# Altium footprint library PCB_Library.PcbLib: 110 footprints (part 7 of 7)
Each footprint in its own frame and in the unit in brackets; x right, y up, seen from the top. Pads: shape width x height; smd on the part's side, far side on the other; paste and mask are expansions set on the pad; w line width, h text height; cw(c..) or ccw(c..) is an arc to the next point about the centre after c.
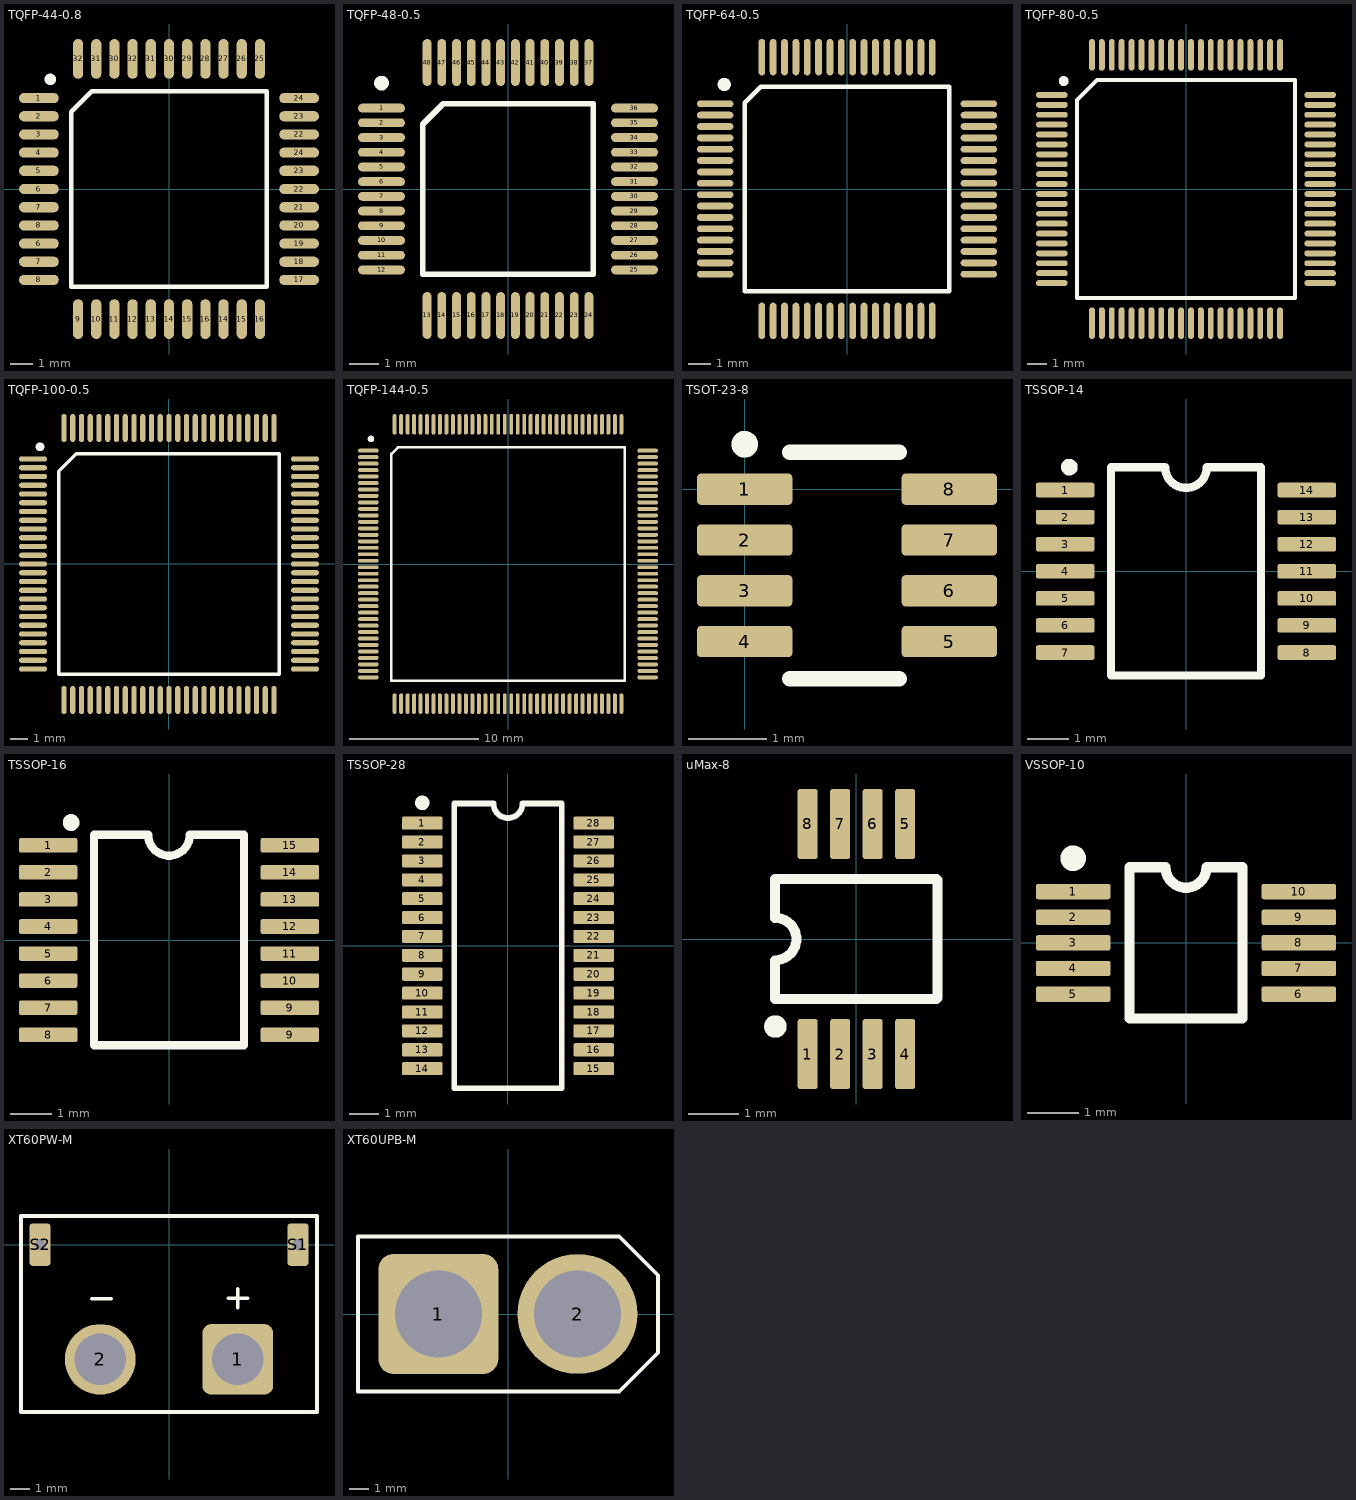
[diagram p6: the footprints below, top view; thin cyan lines are the x and y axes]

## TQFP-44-0.8 [mm]
height 1.2
pads (44):
  oval 1.75x0.45 smd paste-0.075 mask+0.05: 1(-5.725,4) 2(-5.725,3.2) 3(-5.725,2.4) 4(-5.725,1.6) 5(-5.725,0.8) 6(-5.725,-2.4) 6(-5.725,0) 7(-5.725,-3.2) 7(-5.725,-0.8) 8(-5.725,-4) 8(-5.725,-1.6) 17(5.725,-4) 18(5.725,-3.2) 19(5.725,-2.4) 20(5.725,-1.6) 21(5.725,-0.8) 22(5.725,0) 22(5.725,2.4) 23(5.725,0.8) 23(5.725,3.2) 24(5.725,1.6) 24(5.725,4)
  oval 0.45x1.75 smd paste-0.075 mask+0.05: 9(-4,-5.725) 10(-3.2,-5.725) 11(-2.4,-5.725) 12(-1.6,-5.725) 13(-0.8,-5.725) 14(0,-5.725) 14(2.4,-5.725) 15(0.8,-5.725) 15(3.2,-5.725) 16(1.6,-5.725) 16(4,-5.725) 25(4,5.725) 26(3.2,5.725) 27(2.4,5.725) 28(1.6,5.725) 29(0.8,5.725) 30(-2.4,5.725) 30(0,5.725) 31(-3.2,5.725) 31(-0.8,5.725) 32(-4,5.725) 32(-1.6,5.725)
Top Overlay:
  circle w0.25: c-5.225,4.825 r0.125
  lines w0.2: -4.3,-4.3 -4.3,3.4 -3.4,4.3 4.3,4.3 4.3,-4.3 -4.3,-4.3
3D body "TQFP80P1200X1200X105-44N.step": height 1.05, standoff 0, extent -6,-6 6,6

## TQFP-48-0.5 [mm]
pads (48):
  oval 1.6x0.3 smd paste-0.05 mask+0.05: 1(-4.3,2.75) 2(-4.3,2.25) 3(-4.3,1.75) 4(-4.3,1.25) 5(-4.3,0.75) 6(-4.3,0.25) 7(-4.3,-0.25) 8(-4.3,-0.75) 9(-4.3,-1.25) 10(-4.3,-1.75) 11(-4.3,-2.25) 12(-4.3,-2.75) 25(4.3,-2.75) 26(4.3,-2.25) 27(4.3,-1.75) 28(4.3,-1.25) 29(4.3,-0.75) 30(4.3,-0.25) 31(4.3,0.25) 32(4.3,0.75) 33(4.3,1.25) 34(4.3,1.75) 35(4.3,2.25) 36(4.3,2.75)
  oval 0.3x1.6 smd paste-0.05 mask+0.05: 13(-2.75,-4.3) 14(-2.25,-4.3) 15(-1.75,-4.3) 16(-1.25,-4.3) 17(-0.75,-4.3) 18(-0.25,-4.3) 19(0.25,-4.3) 20(0.75,-4.3) 21(1.25,-4.3) 22(1.75,-4.3) 23(2.25,-4.3) 24(2.75,-4.3) 37(2.75,4.3) 38(2.25,4.3) 39(1.75,4.3) 40(1.25,4.3) 41(0.75,4.3) 42(0.25,4.3) 43(-0.25,4.3) 44(-0.75,4.3) 45(-1.25,4.3) 46(-1.75,4.3) 47(-2.25,4.3) 48(-2.75,4.3)
Top Overlay:
  circle w0.3: c-4.3,3.6 r0.1
  lines w0.2: -2.9,-2.9 -2.7,-2.9 2.9,-2.9 2.9,2.9 -0.3,2.9 -2.2,2.9 -2.9,2.2 -2.9,-2.9
3D body "TSQFP50P900X900X120-48N.step": height 1.2, standoff 0, extent -4.5,-4.5 4.5,4.5

## TQFP-64-0.5 [mm]
pads (64):
  oval 1.6x0.3 smd paste-0.05 mask+0.05: 1(-5.8,3.75) 2(-5.8,3.25) 3(-5.8,2.75) 4(-5.8,2.25) 5(-5.8,1.75) 6(-5.8,1.25) 7(-5.8,0.75) 8(-5.8,0.25) 9(-5.8,-0.25) 10(-5.8,-0.75) 11(-5.8,-1.25) 12(-5.8,-1.75) 13(-5.8,-2.25) 14(-5.8,-2.75) 15(-5.8,-3.25) 16(-5.8,-3.75) 33(5.8,-3.75) 34(5.8,-3.25) 35(5.8,-2.75) 36(5.8,-2.25) 37(5.8,-1.75) 38(5.8,-1.25) 39(5.8,-0.75) 40(5.8,-0.25) 41(5.8,0.25) 42(5.8,0.75) 43(5.8,1.25) 44(5.8,1.75) 45(5.8,2.25) 46(5.8,2.75) 47(5.8,3.25) 48(5.8,3.75)
  oval 0.3x1.6 smd paste-0.05 mask+0.05: 17(-3.75,-5.8) 18(-3.25,-5.8) 19(-2.75,-5.8) 20(-2.25,-5.8) 21(-1.75,-5.8) 22(-1.25,-5.8) 23(-0.75,-5.8) 24(-0.25,-5.8) 25(0.25,-5.8) 26(0.75,-5.8) 27(1.25,-5.8) 28(1.75,-5.8) 29(2.25,-5.8) 30(2.75,-5.8) 31(3.25,-5.8) 32(3.75,-5.8) 49(3.75,5.8) 50(3.25,5.8) 51(2.75,5.8) 52(2.25,5.8) 53(1.75,5.8) 54(1.25,5.8) 55(0.75,5.8) 56(0.25,5.8) 57(-0.25,5.8) 58(-0.75,5.8) 59(-1.25,5.8) 60(-1.75,5.8) 61(-2.25,5.8) 62(-2.75,5.8) 63(-3.25,5.8) 64(-3.75,5.8)
Top Overlay:
  circle w0.3: c-5.4,4.6 r0.141
  lines w0.2: -4.5,-4.5 -4.5,3.8 -3.8,4.5 -0.9,4.5 4.5,4.5 4.5,-4.5 -4.5,-4.5
3D body "TSQFP50P1200X1200X105-64N.step": height 1.05, standoff 0, extent -6,-6 6,6

## TQFP-80-0.5 [mm]
height 1.2
pads (80):
  oval 1.6x0.3 smd paste-0.05 mask+0.05: 1(-6.775,4.75) 2(-6.775,4.25) 3(-6.775,3.75) 4(-6.775,3.25) 5(-6.775,2.75) 6(-6.775,2.25) 7(-6.775,1.75) 8(-6.775,1.25) 9(-6.775,0.75) 10(-6.775,0.25) 11(-6.775,-0.25) 12(-6.775,-0.75) 13(-6.775,-1.25) 14(-6.775,-1.75) 15(-6.775,-2.25) 16(-6.775,-2.75) 17(-6.775,-3.25) 18(-6.775,-3.75) 19(-6.775,-4.25) 20(-6.775,-4.75) 41(6.775,-4.75) 42(6.775,-4.25) 43(6.775,-3.75) 44(6.775,-3.25) 45(6.775,-2.75) 46(6.775,-2.25) 47(6.775,-1.75) 48(6.775,-1.25) 49(6.775,-0.75) 50(6.775,-0.25) 51(6.775,0.25) 52(6.775,0.75) 53(6.775,1.25) 54(6.775,1.75) 55(6.775,2.25) 56(6.775,2.75) 57(6.775,3.25) 58(6.775,3.75) 59(6.775,4.25) 60(6.775,4.75)
  oval 0.3x1.6 smd paste-0.05 mask+0.05: 21(-4.75,-6.775) 22(-4.25,-6.775) 23(-3.75,-6.775) 24(-3.25,-6.775) 25(-2.75,-6.775) 26(-2.25,-6.775) 27(-1.75,-6.775) 28(-1.25,-6.775) 29(-0.75,-6.775) 30(-0.25,-6.775) 31(0.25,-6.775) 32(0.75,-6.775) 33(1.25,-6.775) 34(1.75,-6.775) 35(2.25,-6.775) 36(2.75,-6.775) 37(3.25,-6.775) 38(3.75,-6.775) 39(4.25,-6.775) 40(4.75,-6.775) 61(4.75,6.775) 62(4.25,6.775) 63(3.75,6.775) 64(3.25,6.775) 65(2.75,6.775) 66(2.25,6.775) 67(1.75,6.775) 68(1.25,6.775) 69(0.75,6.775) 70(0.25,6.775) 71(-0.25,6.775) 72(-0.75,6.775) 73(-1.25,6.775) 74(-1.75,6.775) 75(-2.25,6.775) 76(-2.75,6.775) 77(-3.25,6.775) 78(-3.75,6.775) 79(-4.25,6.775) 80(-4.75,6.775)
Top Overlay:
  circle w0.25: c-6.175,5.45 r0.125
  lines w0.2: -5.5,-5.5 -5.5,4.5 -4.5,5.5 5.5,5.5 5.5,-5.5 -5.5,-5.5
3D body "TSQFP50P1400X1400X150-80N.step": height 1.5, standoff 0, extent -7,-7 7,7

## TQFP-100-0.5 [mm]
height 1.1
pads (100):
  oval 1.6x0.3 smd paste-0.05 mask+0.05: 1(-7.775,6) 2(-7.775,5.5) 3(-7.775,5) 4(-7.775,4.5) 5(-7.775,4) 6(-7.775,3.5) 7(-7.775,3) 8(-7.775,2.5) 9(-7.775,2) 10(-7.775,1.5) 11(-7.775,1) 12(-7.775,0.5) 13(-7.775,0) 14(-7.775,-0.5) 15(-7.775,-1) 16(-7.775,-1.5) 17(-7.775,-2) 18(-7.775,-2.5) 19(-7.775,-3) 20(-7.775,-3.5) 21(-7.775,-4) 22(-7.775,-4.5) 23(-7.775,-5) 24(-7.775,-5.5) 25(-7.775,-6) 51(7.775,-6) 52(7.775,-5.5) 53(7.775,-5) 54(7.775,-4.5) 55(7.775,-4) 56(7.775,-3.5) 57(7.775,-3) 58(7.775,-2.5) 59(7.775,-2) 60(7.775,-1.5) 61(7.775,-1) 62(7.775,-0.5) 63(7.775,0) 64(7.775,0.5) 65(7.775,1) 66(7.775,1.5) 67(7.775,2) 68(7.775,2.5) 69(7.775,3) 70(7.775,3.5) 71(7.775,4) 72(7.775,4.5) 73(7.775,5) 74(7.775,5.5) 75(7.775,6)
  oval 0.3x1.6 smd paste-0.05 mask+0.05: 26(-6,-7.775) 27(-5.5,-7.775) 28(-5,-7.775) 29(-4.5,-7.775) 30(-4,-7.775) 31(-3.5,-7.775) 32(-3,-7.775) 33(-2.5,-7.775) 34(-2,-7.775) 35(-1.5,-7.775) 36(-1,-7.775) 37(-0.5,-7.775) 38(0,-7.775) 39(0.5,-7.775) 40(1,-7.775) 41(1.5,-7.775) 42(2,-7.775) 43(2.5,-7.775) 44(3,-7.775) 45(3.5,-7.775) 46(4,-7.775) 47(4.5,-7.775) 48(5,-7.775) 49(5.5,-7.775) 50(6,-7.775) 76(6,7.775) 77(5.5,7.775) 78(5,7.775) 79(4.5,7.775) 80(4,7.775) 81(3.5,7.775) 82(3,7.775) 83(2.5,7.775) 84(2,7.775) 85(1.5,7.775) 86(1,7.775) 87(0.5,7.775) 88(0,7.775) 89(-0.5,7.775) 90(-1,7.775) 91(-1.5,7.775) 92(-2,7.775) 93(-2.5,7.775) 94(-3,7.775) 95(-3.5,7.775) 96(-4,7.775) 97(-4.5,7.775) 98(-5,7.775) 99(-5.5,7.775) 100(-6,7.775)
Top Overlay:
  circle w0.25: c-7.375,6.7 r0.125
  lines w0.2: -6.3,-6.3 -6.3,5.3 -5.3,6.3 6.3,6.3 6.3,-6.3 -6.3,-6.3
3D body "TSQFP50P1600X1600X105-100N.step": height 1.05, standoff 0, extent -8,-8 8,8

## TQFP-144-0.5 [mm]
height 1.6
pads (144):
  oval 1.6x0.3 smd paste-0.05 mask+0.05: 1(-10.775,8.75) 2(-10.775,8.25) 3(-10.775,7.75) 4(-10.775,7.25) 5(-10.775,6.75) 6(-10.775,6.25) 7(-10.775,5.75) 8(-10.775,5.25) 9(-10.775,4.75) 10(-10.775,4.25) 11(-10.775,3.75) 12(-10.775,3.25) 13(-10.775,2.75) 14(-10.775,2.25) 15(-10.775,1.75) 16(-10.775,1.25) 17(-10.775,0.75) 18(-10.775,0.25) 19(-10.775,-0.25) 20(-10.775,-0.75) 21(-10.775,-1.25) 22(-10.775,-1.75) 23(-10.775,-2.25) 24(-10.775,-2.75) 25(-10.775,-3.25) 26(-10.775,-3.75) 27(-10.775,-4.25) 28(-10.775,-4.75) 29(-10.775,-5.25) 30(-10.775,-5.75) 31(-10.775,-6.25) 32(-10.775,-6.75) 33(-10.775,-7.25) 34(-10.775,-7.75) 35(-10.775,-8.25) 36(-10.775,-8.75) 73(10.775,-8.75) 74(10.775,-8.25) 75(10.775,-7.75) 76(10.775,-7.25) 77(10.775,-6.75) 78(10.775,-6.25) 79(10.775,-5.75) 80(10.775,-5.25) 81(10.775,-4.75) 82(10.775,-4.25) 83(10.775,-3.75) 84(10.775,-3.25) 85(10.775,-2.75) 86(10.775,-2.25) 87(10.775,-1.75) 88(10.775,-1.25) 89(10.775,-0.75) 90(10.775,-0.25) 91(10.775,0.25) 92(10.775,0.75) 93(10.775,1.25) 94(10.775,1.75) 95(10.775,2.25) 96(10.775,2.75) 97(10.775,3.25) 98(10.775,3.75) 99(10.775,4.25) 100(10.775,4.75) 101(10.775,5.25) 102(10.775,5.75) 103(10.775,6.25) 104(10.775,6.75) 105(10.775,7.25) 106(10.775,7.75) 107(10.775,8.25) 108(10.775,8.75)
  oval 0.3x1.6 smd paste-0.05 mask+0.05: 37(-8.75,-10.775) 38(-8.25,-10.775) 39(-7.75,-10.775) 40(-7.25,-10.775) 41(-6.75,-10.775) 42(-6.25,-10.775) 43(-5.75,-10.775) 44(-5.25,-10.775) 45(-4.75,-10.775) 46(-4.25,-10.775) 47(-3.75,-10.775) 48(-3.25,-10.775) 49(-2.75,-10.775) 50(-2.25,-10.775) 51(-1.75,-10.775) 52(-1.25,-10.775) 53(-0.75,-10.775) 54(-0.25,-10.775) 55(0.25,-10.775) 56(0.75,-10.775) 57(1.25,-10.775) 58(1.75,-10.775) 59(2.25,-10.775) 60(2.75,-10.775) 61(3.25,-10.775) 62(3.75,-10.775) 63(4.25,-10.775) 64(4.75,-10.775) 65(5.25,-10.775) 66(5.75,-10.775) 67(6.25,-10.775) 68(6.75,-10.775) 69(7.25,-10.775) 70(7.75,-10.775) 71(8.25,-10.775) 72(8.75,-10.775) 109(8.75,10.775) 110(8.25,10.775) 111(7.75,10.775) 112(7.25,10.775) 113(6.75,10.775) 114(6.25,10.775) 115(5.75,10.775) 116(5.25,10.775) 117(4.75,10.775) 118(4.25,10.775) 119(3.75,10.775) 120(3.25,10.775) 121(2.75,10.775) 122(2.25,10.775) 123(1.75,10.775) 124(1.25,10.775) 125(0.75,10.775) 126(0.25,10.775) 127(-0.25,10.775) 128(-0.75,10.775) 129(-1.25,10.775) 130(-1.75,10.775) 131(-2.25,10.775) 132(-2.75,10.775) 133(-3.25,10.775) 134(-3.75,10.775) 135(-4.25,10.775) 136(-4.75,10.775) 137(-5.25,10.775) 138(-5.75,10.775) 139(-6.25,10.775) 140(-6.75,10.775) 141(-7.25,10.775) 142(-7.75,10.775) 143(-8.25,10.775) 144(-8.75,10.775)
Top Overlay:
  circle w0.25: c-10.575,9.65 r0.125
  lines w0.2: -9,-9 9,-9 9,9 -8.5,9 -9,8.5 -9,-9
3D body "TSQFP50P2200X2200X120-144N.step": height 1.2, standoff 0, extent -11,-11 11,11

## TSOT-23-8 [mm]
pads (8):
  rrect25% 1.22x0.4 smd paste-0.05 mask+0.05: 1(0,0) 2(0,-0.65) 3(0,-1.3) 4(0,-1.95) 5(2.62,-1.95) 6(2.62,-1.3) 7(2.62,-0.65) 8(2.62,0)
Top Overlay:
  circle w0.2: c0,0.575 r0.071
  lines w0.2: 0.575,-2.425 1.975,-2.425 ; 0.575,0.475 1.975,0.475
3D body "User Library-TSOT-23-8.STEP": height 1, standoff 0, extent -0.1,-2.425 2.7,0.475

## TSSOP-14 [mm]
height 1.1
pads (14):
  rrect25% 1.4x0.35 smd paste-0.05 mask+0.05: 1(-2.9,1.95) 2(-2.9,1.3) 3(-2.9,0.65) 4(-2.9,0) 5(-2.9,-0.65) 6(-2.9,-1.3) 7(-2.9,-1.95) 8(2.9,-1.95) 9(2.9,-1.3) 10(2.9,-0.65) 11(2.9,0) 12(2.9,0.65) 13(2.9,1.3) 14(2.9,1.95)
Top Overlay:
  circle w0.25: c-2.8,2.5 r0.075
  lines w0.2: -1.8,-2.5 -1.8,2.5 -0.5,2.5 ccw(c0,2.5) 0.5,2.5 1.8,2.5 1.8,-2.5 -1.8,-2.5
3D body "SOP127P600-8N.step": height 1.2, standoff 0, extent -3.2,-2.55 3.2,2.55

## TSSOP-16 [mm]
height 1.1
pads (16):
  rrect25% 1.4x0.35 smd paste-0.05 mask+0.05: 1(-2.9,2.275) 2(-2.9,1.625) 3(-2.9,0.975) 4(-2.9,0.325) 5(-2.9,-0.325) 6(-2.9,-0.975) 7(-2.9,-1.625) 8(-2.9,-2.275) 9(2.9,-2.275) 9(2.9,-1.625) 10(2.9,-0.975) 11(2.9,-0.325) 12(2.9,0.325) 13(2.9,0.975) 14(2.9,1.625) 15(2.9,2.275)
Top Overlay:
  circle w0.25: c-2.35,2.82 r0.075
  lines w0.2: -1.8,-2.525 -1.8,2.525 -0.5,2.525 ccw(c0,2.525) 0.5,2.525 1.8,2.525 1.8,-2.525 -1.8,-2.525
3D body "sdfg.step": height 1.2, standoff 0, extent -3.2,-2.55 3.2,2.55

## TSSOP-28 [mm]
height 1.1
pads (28):
  rrect25% 1.4x0.45 smd paste-0.05 mask+0.05: 1(-2.95,4.225) 2(-2.95,3.575) 3(-2.95,2.925) 4(-2.95,2.275) 5(-2.95,1.625) 6(-2.95,0.975) 7(-2.95,0.325) 8(-2.95,-0.325) 9(-2.95,-0.975) 10(-2.95,-1.625) 11(-2.95,-2.275) 12(-2.95,-2.925) 13(-2.95,-3.575) 14(-2.95,-4.225) 15(2.95,-4.225) 16(2.95,-3.575) 17(2.95,-2.925) 18(2.95,-2.275) 19(2.95,-1.625) 20(2.95,-0.975) 21(2.95,-0.325) 22(2.95,0.325) 23(2.95,0.975) 24(2.95,1.625) 25(2.95,2.275) 26(2.95,2.925) 27(2.95,3.575) 28(2.95,4.225)
Top Overlay:
  circle w0.25: c-2.95,4.925 r0.125
  lines w0.2: -1.85,-4.9 -1.85,4.9 -0.5,4.9 ccw(c0,4.9) 0.5,4.9 1.85,4.9 1.85,-4.9 -1.85,-4.9
3D body "User Library-TSSOP-28.STEP": height 1.2, standoff 0, extent -3.2,-4.85 3.2,4.85

## uMax-8 [mm]
pads (8):
  rrect25% 0.4x1.4 smd paste-0.05 mask+0.05: 1(-0.975,-2.3) 2(-0.325,-2.3) 3(0.325,-2.3) 4(0.975,-2.3) 5(0.975,2.3) 6(0.325,2.3) 7(-0.325,2.3) 8(-0.975,2.3)
Top Overlay:
  circle w0.25: c-1.62,-1.75 r0.1
  lines w0.2: -1.625,-1.2 -1.6,-1.2 1.6,-1.2 1.625,-1.175 1.625,1.175 1.6,1.2 -1.625,1.2 -1.625,0.425 cw(c-1.625,0) -1.625,-0.425 -1.625,-1.2
3D body "MSOP-8.step": height 1.1, standoff 0, extent -1.6,-2.45 1.6,2.45

## VSSOP-10 [mm]
height 1.1
pads (10):
  rrect25% 1.45x0.3 smd paste-0.025 mask+0.05: 1(-2.2,1) 2(-2.2,0.5) 3(-2.2,0) 4(-2.2,-0.5) 5(-2.2,-1) 6(2.2,-1) 7(2.2,-0.5) 8(2.2,0) 9(2.2,0.5) 10(2.2,1)
Top Overlay:
  circle w0.25: c-2.2,1.65 r0.125
  lines w0.2: -1.1,-1.475 1.1,-1.475 1.1,1.475 0.4,1.475 cw(c0,1.475) -0.4,1.475 -1.1,1.475 -1.1,-1.475
3D body "IC_Texas_Instruments_TS5A23159DGSR_eec.STEP": height 1.1, standoff 0, extent -2.45,-1.5 2.45,1.5

## XT60PW-M [mm]
pads (4):
  rrect25% 3.7x3.7 hole 2.7 mask+0.05: 1(3.6,-6)
  round 3.7 hole 2.7 mask+0.05: 2(-3.6,-6)
  rrect25% 1.1x2.2 hole 0.6 square mask+0.05: S1(6.75,0) S2(-6.75,0)
Top Overlay:
  lines w0.2: -4.041,-2.823 -3.041,-2.823 ; 3.1,-2.8 4.1,-2.8 ; 3.6,-3.3 3.6,-2.3 ; -7.75,-8.75 -7.75,-0.5 -7.75,1.5 7.75,1.5 7.75,-8.75 -7.75,-8.75
3D body "XT60PW MALE.STEP": height 8.41, standoff -1.99, extent -7.75,-8.9 7.75,9.3

## XT60UPB-M [mm]
pads (2):
  rrect25% 6.2x6.2 hole 4.5 mask+0.05: 1(-3.6,0)
  round 6.2 hole 4.5 mask+0.05: 2(3.6,0)
Top Overlay:
  lines w0.2: -7.75,-4 -7.75,4 5.75,4 7.75,2 7.75,-2 5.75,-4 -7.75,-4
3D body "User Library-XT60UPB Male Vert.STEP": height 13.54, standoff -2.06, extent -7.65,-3.95 7.692,3.95